# Altium footprint library SparkFun-Connectors.PCBLIB: 409 footprints (part 17 of 26)
Each footprint in its own frame and in the unit in brackets; x right, y up, seen from the top. Pads: shape width x height; smd on the part's side, far side on the other; paste and mask are expansions set on the pad; w line width, h text height; cw(c..) or ccw(c..) is an arc to the next point about the centre after c.
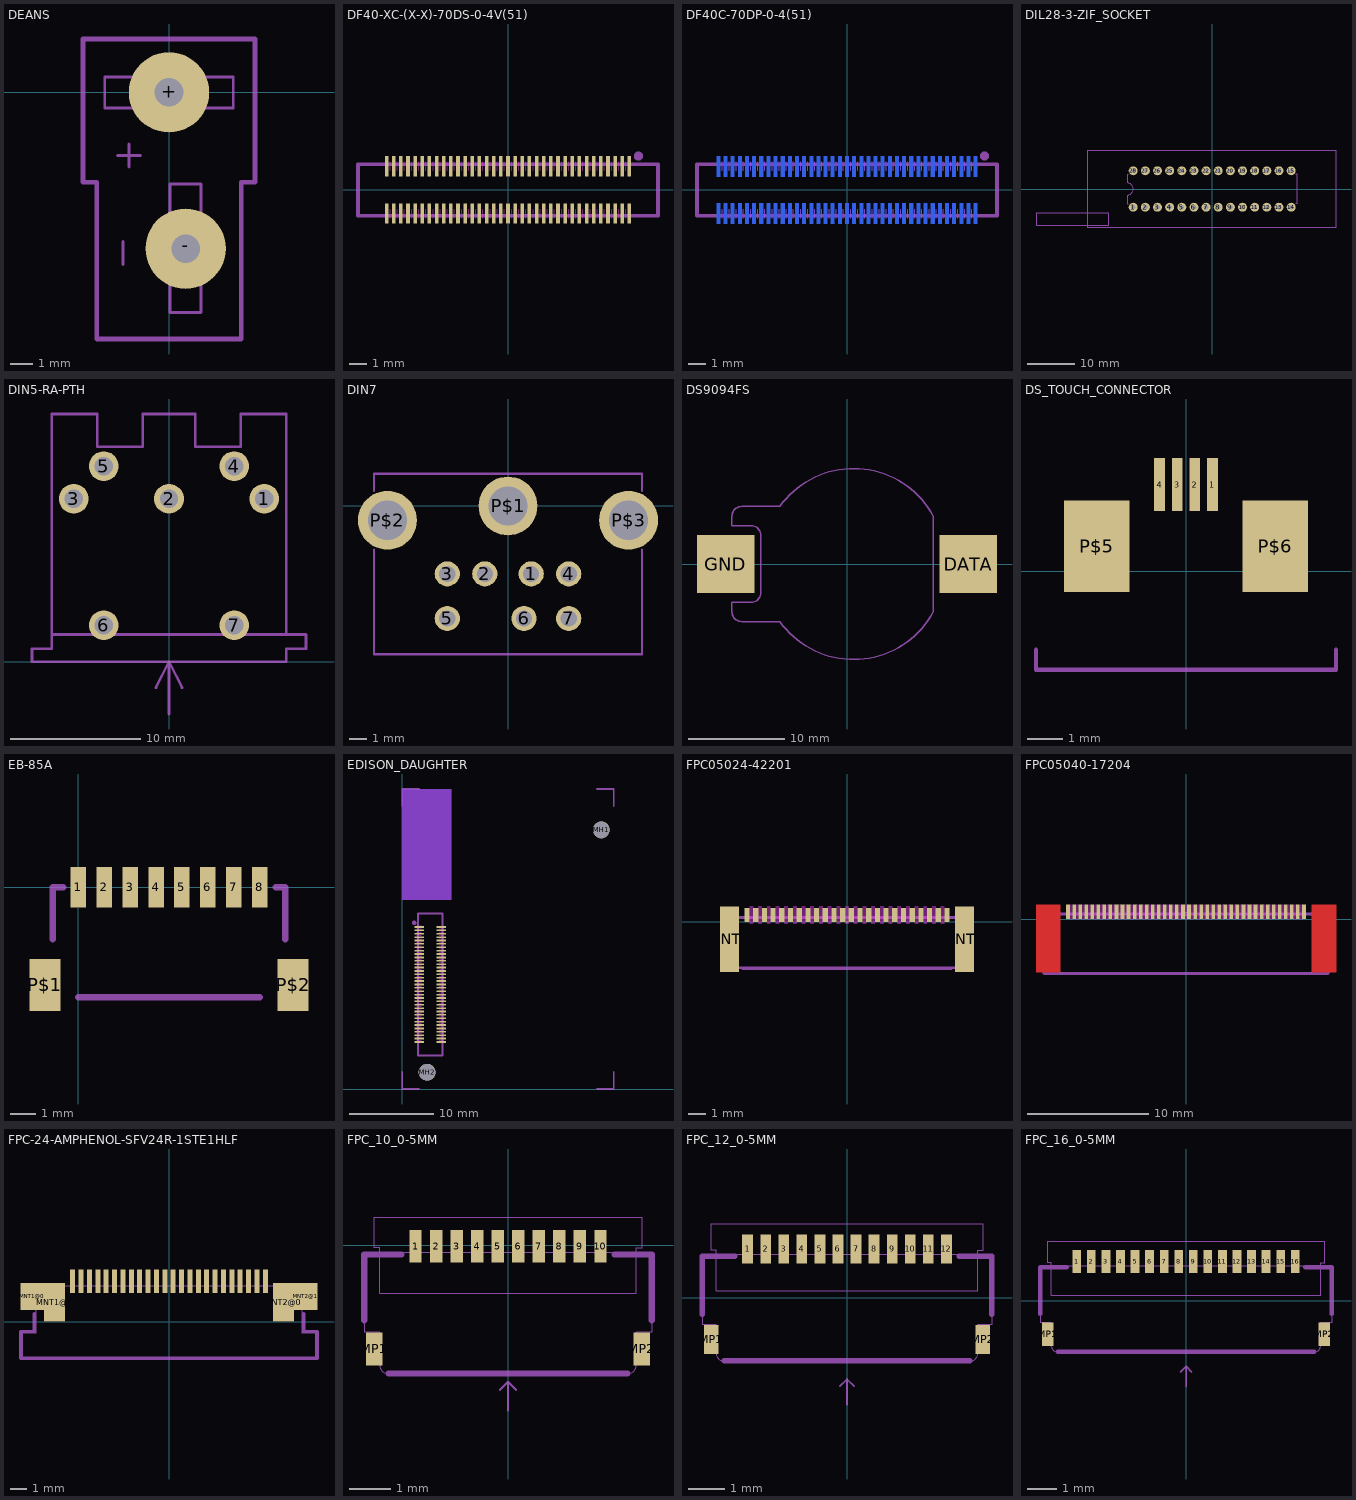
[diagram p16: the footprints below, top view; thin cyan lines are the x and y axes]

## DEANS [mil]
pads (2):
  round 140 hole 50: +(0,0) -(29,-272.5)
Dimension:
  lines w5: -112,-27 112,-27 112,27 -112,27 -112,-27 ; 2,-384 2,-160 56,-160 56,-384 2,-384
tPlace:
  lines w5: -90,-110 -50,-110 ; -80,-300 -80,-260 ; -70,-130 -70,-90
  lines w8: -150,-157 -150,93 150,93 150,-157 126,-157 126,-430 -126,-430 -126,-157 -150,-157

## DF40-XC-(X-X)-70DS-0-4V(51) [mm]
pads (70):
  rect 0.2x1.14 smd: 1(6.8,1.32) 2(6.8,-1.32) 3(6.4,1.32) 4(6.4,-1.32) 5(6,1.32) 6(6,-1.32) 7(5.6,1.32) 8(5.6,-1.32) 9(5.2,1.32) 10(5.2,-1.32) 11(4.8,1.32) 12(4.8,-1.32) 13(4.4,1.32) 14(4.4,-1.32) 15(4,1.32) 16(4,-1.32) 17(3.6,1.32) 18(3.6,-1.32) 19(3.2,1.32) 20(3.2,-1.32) 21(2.8,1.32) 22(2.8,-1.32) 23(2.4,1.32) 24(2.4,-1.32) 25(2,1.32) 26(2,-1.32) 27(1.6,1.32) 28(1.6,-1.32) 29(1.2,1.32) 30(1.2,-1.32) 31(0.8,1.32) 32(0.8,-1.32) 33(0.4,1.32) 34(0.4,-1.32) 35(0,1.32) 36(0,-1.32) 37(-0.4,1.32) 38(-0.4,-1.32) 39(-0.8,1.32) 40(-0.8,-1.32) 41(-1.2,1.32) 42(-1.2,-1.32) 43(-1.6,1.32) 44(-1.6,-1.32) 45(-2,1.32) 46(-2,-1.32) 47(-2.4,1.32) 48(-2.4,-1.32) 49(-2.8,1.32) 50(-2.8,-1.32) 51(-3.2,1.32) 52(-3.2,-1.32) 53(-3.6,1.32) 54(-3.6,-1.32) 55(-4,1.32) 56(-4,-1.32) 57(-4.4,1.32) 58(-4.4,-1.32) 59(-4.8,1.32) 60(-4.8,-1.32) 61(-5.2,1.32) 62(-5.2,-1.32) 63(-5.6,1.32) 64(-5.6,-1.32) 65(-6,1.32) 66(-6,-1.32) 67(-6.4,1.32) 68(-6.4,-1.32) 69(-6.8,1.32) 70(-6.8,-1.32)
Top keep-out:
  lines w0.051: -6.6,-1.581 -6.6,-1.069 ; -6.6,1.064 -6.6,1.576 ; -6.2,-1.581 -6.2,-1.069 ; -6.2,1.064 -6.2,1.576 ; -5.8,-1.581 -5.8,-1.069 ; -5.8,1.064 -5.8,1.576 ; -5.4,-1.581 -5.4,-1.069 ; -5.4,1.064 -5.4,1.576 ; -5,-1.581 -5,-1.069 ; -5,1.064 -5,1.576 ; -4.6,-1.581 -4.6,-1.069 ; -4.6,1.064 -4.6,1.576 ; -4.2,-1.581 -4.2,-1.069 ; -4.2,1.064 -4.2,1.576 ; -3.8,-1.581 -3.8,-1.069 ; -3.8,1.064 -3.8,1.576 ; -3.4,-1.581 -3.4,-1.069 ; -3.4,1.064 -3.4,1.576 ; -3,-1.581 -3,-1.069 ; -3,1.064 -3,1.576 ; -2.6,-1.581 -2.6,-1.069 ; -2.6,1.064 -2.6,1.576 ; -2.2,-1.581 -2.2,-1.069 ; -2.2,1.064 -2.2,1.576 ; -1.8,-1.581 -1.8,-1.069 ; -1.8,1.064 -1.8,1.576 ; -1.4,-1.581 -1.4,-1.069 ; -1.4,1.064 -1.4,1.576 ; -1,-1.581 -1,-1.069 ; -1,1.064 -1,1.576 ; -0.6,-1.581 -0.6,-1.069 ; -0.6,1.064 -0.6,1.576 ; -0.2,-1.581 -0.2,-1.069 ; -0.2,1.064 -0.2,1.576 ; 0.2,-1.581 0.2,-1.069 ; 0.2,1.064 0.2,1.576 ; 0.6,-1.581 0.6,-1.069 ; 0.6,1.064 0.6,1.576 ; 1,-1.581 1,-1.069 ; 1,1.064 1,1.576 ; 1.4,-1.581 1.4,-1.069 ; 1.4,1.064 1.4,1.576 ; 1.8,-1.581 1.8,-1.069 ; 1.8,1.064 1.8,1.576 ; 2.2,-1.581 2.2,-1.069 ; 2.2,1.064 2.2,1.576 ; 2.6,-1.581 2.6,-1.069 ; 2.6,1.064 2.6,1.576 ; 3,-1.581 3,-1.069 ; 3,1.064 3,1.576 ; 3.4,-1.581 3.4,-1.069 ; 3.4,1.064 3.4,1.576 ; 3.8,-1.581 3.8,-1.069 ; 3.8,1.064 3.8,1.576 ; 4.2,-1.581 4.2,-1.069 ; 4.2,1.064 4.2,1.576 ; 4.6,-1.581 4.6,-1.069 ; 4.6,1.064 4.6,1.576 ; 5,-1.581 5,-1.069 ; 5,1.064 5,1.576 ; 5.4,-1.581 5.4,-1.069 ; 5.4,1.064 5.4,1.576 ; 5.8,-1.581 5.8,-1.069 ; 5.8,1.064 5.8,1.576 ; 6.2,-1.581 6.2,-1.069 ; 6.2,1.064 6.2,1.576 ; 6.6,-1.581 6.6,-1.069 ; 6.6,1.064 6.6,1.576
tPlace:
  circle w0.305: c7.3,1.9 r0.1
  lines w0.203: -8.4,-1.44 8.4,-1.44 8.4,1.44 -8.4,1.44 -8.4,-1.44

## DF40C-70DP-0-4(51) [mm]
pads (74):
  rect 0.2x1.14 smd far side: 1(6.8,1.32) 2(6.8,-1.32) 3(6.4,1.32) 4(6.4,-1.32) 5(6,1.32) 6(6,-1.32) 7(5.6,1.32) 8(5.6,-1.32) 9(5.2,1.32) 10(5.2,-1.32) 11(4.8,1.32) 12(4.8,-1.32) 13(4.4,1.32) 14(4.4,-1.32) 15(4,1.32) 16(4,-1.32) 17(3.6,1.32) 18(3.6,-1.32) 19(3.2,1.32) 20(3.2,-1.32) 21(2.8,1.32) 22(2.8,-1.32) 23(2.4,1.32) 24(2.4,-1.32) 25(2,1.32) 26(2,-1.32) 27(1.6,1.32) 28(1.6,-1.32) 29(1.2,1.32) 30(1.2,-1.32) 31(0.8,1.32) 32(0.8,-1.32) 33(0.4,1.32) 34(0.4,-1.32) 35(0,1.32) 36(0,-1.32) 37(-0.4,1.32) 38(-0.4,-1.32) 39(-0.8,1.32) 40(-0.8,-1.32) 41(-1.2,1.32) 42(-1.2,-1.32) 43(-1.6,1.32) 44(-1.6,-1.32) 45(-2,1.32) 46(-2,-1.32) 47(-2.4,1.32) 48(-2.4,-1.32) 49(-2.8,1.32) 50(-2.8,-1.32) 51(-3.2,1.32) 52(-3.2,-1.32) 53(-3.6,1.32) 54(-3.6,-1.32) 55(-4,1.32) 56(-4,-1.32) 57(-4.4,1.32) 58(-4.4,-1.32) 59(-4.8,1.32) 60(-4.8,-1.32) 61(-5.2,1.32) 62(-5.2,-1.32) 63(-5.6,1.32) 64(-5.6,-1.32) 65(-6,1.32) 66(-6,-1.32) 67(-6.4,1.32) 68(-6.4,-1.32) 69(-6.8,1.32) 70(-6.8,-1.32) NC1(7.2,1.32) NC2(7.2,-1.32) NC3(-7.2,-1.32) NC4(-7.2,1.32)
Bottom keep-out:
  lines w0.051: -7,-1.581 -7,-1.069 ; -7,1.064 -7,1.576 ; -6.6,-1.581 -6.6,-1.069 ; -6.6,1.064 -6.6,1.576 ; -6.2,-1.581 -6.2,-1.069 ; -6.2,1.064 -6.2,1.576 ; -5.8,-1.581 -5.8,-1.069 ; -5.8,1.064 -5.8,1.576 ; -5.4,-1.581 -5.4,-1.069 ; -5.4,1.064 -5.4,1.576 ; -5,-1.581 -5,-1.069 ; -5,1.064 -5,1.576 ; -4.6,-1.581 -4.6,-1.069 ; -4.6,1.064 -4.6,1.576 ; -4.2,-1.581 -4.2,-1.069 ; -4.2,1.064 -4.2,1.576 ; -3.8,-1.581 -3.8,-1.069 ; -3.8,1.064 -3.8,1.576 ; -3.4,-1.581 -3.4,-1.069 ; -3.4,1.064 -3.4,1.576 ; -3,-1.581 -3,-1.069 ; -3,1.064 -3,1.576 ; -2.6,-1.581 -2.6,-1.069 ; -2.6,1.064 -2.6,1.576 ; -2.2,-1.581 -2.2,-1.069 ; -2.2,1.064 -2.2,1.576 ; -1.8,-1.581 -1.8,-1.069 ; -1.8,1.064 -1.8,1.576 ; -1.4,-1.581 -1.4,-1.069 ; -1.4,1.064 -1.4,1.576 ; -1,-1.581 -1,-1.069 ; -1,1.064 -1,1.576 ; -0.6,-1.581 -0.6,-1.069 ; -0.6,1.064 -0.6,1.576 ; -0.2,-1.581 -0.2,-1.069 ; -0.2,1.064 -0.2,1.576 ; 0.2,-1.581 0.2,-1.069 ; 0.2,1.064 0.2,1.576 ; 0.6,-1.581 0.6,-1.069 ; 0.6,1.064 0.6,1.576 ; 1,-1.581 1,-1.069 ; 1,1.064 1,1.576 ; 1.4,-1.581 1.4,-1.069 ; 1.4,1.064 1.4,1.576 ; 1.8,-1.581 1.8,-1.069 ; 1.8,1.064 1.8,1.576 ; 2.2,-1.581 2.2,-1.069 ; 2.2,1.064 2.2,1.576 ; 2.6,-1.581 2.6,-1.069 ; 2.6,1.064 2.6,1.576 ; 3,-1.581 3,-1.069 ; 3,1.064 3,1.576 ; 3.4,-1.581 3.4,-1.069 ; 3.4,1.064 3.4,1.576 ; 3.8,-1.581 3.8,-1.069 ; 3.8,1.064 3.8,1.576 ; 4.2,-1.581 4.2,-1.069 ; 4.2,1.064 4.2,1.576 ; 4.6,-1.581 4.6,-1.069 ; 4.6,1.064 4.6,1.576 ; 5,-1.581 5,-1.069 ; 5,1.064 5,1.576 ; 5.4,-1.581 5.4,-1.069 ; 5.4,1.064 5.4,1.576 ; 5.8,-1.581 5.8,-1.069 ; 5.8,1.064 5.8,1.576 ; 6.2,-1.581 6.2,-1.069 ; 6.2,1.064 6.2,1.576 ; 6.6,-1.581 6.6,-1.069 ; 6.6,1.064 6.6,1.576 ; 7,-1.581 7,-1.069 ; 7,1.064 7,1.576
bPlace:
  circle w0.305: c7.7,1.9 r0.1
  lines w0.203: -8.4,-1.44 8.4,-1.44 8.4,1.44 -8.4,1.44 -8.4,-1.44

## DIL28-3-ZIF_SOCKET [mil]
pads (28):
  round 74 hole 40: 1(-650,-150) 2(-550,-150) 3(-450,-150) 4(-350,-150) 5(-250,-150) 6(-150,-150) 7(-50,-150) 8(50,-150) 9(150,-150) 10(250,-150) 11(350,-150) 12(450,-150) 13(550,-150) 14(650,-150) 15(650,150) 16(550,150) 17(450,150) 18(350,150) 19(250,150) 20(150,150) 21(50,150) 22(-50,150) 23(-150,150) 24(-250,150) 25(-350,150) 26(-450,150) 27(-550,150) 28(-650,150)
tDocu:
  lines w5: -1027.99,-314.96 1019.25,-314.96 1019.25,314.96 -1027.99,314.96 -1027.99,-314.96
  lines w10: -1450,-300 -1450,-200 -850,-200 -850,-300 -1450,-300
tPlace:
  lines w8: -690,-120 -700,-120 -700,-50 ccw(c-700,0) -700,50 -700,120 -690,120 ; 690,-120 700,-120 700,120 690,120

## DIN5-RA-PTH [mil]
pads (7):
  round 90 hole 55.12: 1(287.4,492.13) 2(0,492.13) 3(-287.4,492.13) 4(196.85,590.55) 5(-196.85,590.55) 6(-196.85,110.24) 7(196.85,110.24)
tDocu:
  lines w8: -157.48,0 0,0 ; -39.37,-78.74 0,0 ; 0,-157.48 0,0 ; 39.37,-78.74 0,0 ; 157.48,0 0,0
  text "BOARD EDGE" at 0,-170 h27.2
tPlace:
  lines w8: -354.33,78.74 -354.33,39.37 -413.39,39.37 -413.39,0 354.33,0 354.33,39.37 413.39,39.37 413.39,82.68 354.33,82.68 ; 354.33,82.68 354.33,748.03 216.54,748.03 216.54,649.61 78.74,649.61 78.74,748.03 -78.74,748.03 -78.74,649.61 -216.54,649.61 -216.54,748.03 -354.33,748.03 -354.33,82.68 354.33,82.68
  text "DIN-5" at -105.12,253.54 h56.1

## DIN7 [mil]
pads (10):
  round 55.43 hole 35.43: 1(51.18,-149.61) 2(-51.18,-149.61) 3(-133.86,-149.61) 4(133.86,-149.61) 5(-133.86,-248.03) 6(35.43,-248.03) 7(133.86,-248.03)
  round 129.91 hole 86.61: P$1(0,0) P$2(-265.75,-31.5) P$3(265.75,-31.5)
tPlace:
  lines w5: -295.28,-96.46 -295.28,-326.77 295.28,-326.77 295.28,-96.46 ; -295.28,33.46 -295.28,70.87 295.28,70.87 295.28,33.46

## DS9094FS [mm]
pads (2):
  rect 6x6 smd: DATA(12.65,0) GND(-12.65,0)
tPlace:
  lines w0.152: -12,-5 -12,-4 -10,-4 ccw(c-10,-3) -9,-3 -9,3 ccw(c-10,3) -10,4 -12,4 -12,5 cw(c-11,5) -11,6 -7,6 cw(c0.688,0.514) 9,5 9,-5 cw(c0.688,-0.514) -7,-6 -11,-6 cw(c-11,-5) -12,-5

## DS_TOUCH_CONNECTOR [mm]
pads (6):
  rect 0.3x1.5 smd: 1(0.75,2.45) 2(0.25,2.45) 3(-0.25,2.45) 4(-0.75,2.45)
  rect 1.85x2.6 smd: P$5(-2.525,0.7) P$6(2.525,0.7)
tPlace:
  lines w0.127: -4.25,-2.23 -4.25,-2.8 4.25,-2.8 4.25,-2.23

## EB-85A [mm]
pads (10):
  rect 0.6x1.55 smd: 1(0,0) 2(1,0) 3(2,0) 4(3,0) 5(4,0) 6(5,0) 7(6,0) 8(7,0)
  rect 1.2x2 smd: P$1(-1.3,-3.775) P$2(8.3,-3.775)
tPlace:
  lines w0.254: -1,-2 -1,0 -0.6,0 ; 0,-4.25 7,-4.25 ; 7.625,0 8,0 8,-2

## EDISON_DAUGHTER [mm]
pads (72):
  rect 1.14x0.2 smd: 1(1.98,19.17) 2(4.62,19.17) 3(1.98,18.77) 4(4.62,18.77) 5(1.98,18.37) 6(4.62,18.37) 7(1.98,17.97) 8(4.62,17.97) 9(1.98,17.57) 10(4.62,17.57) 11(1.98,17.17) 12(4.62,17.17) 13(1.98,16.77) 14(4.62,16.77) 15(1.98,16.37) 16(4.62,16.37) 17(1.98,15.97) 18(4.62,15.97) 19(1.98,15.57) 20(4.62,15.57) 21(1.98,15.17) 22(4.62,15.17) 23(1.98,14.77) 24(4.62,14.77) 25(1.98,14.37) 26(4.62,14.37) 27(1.98,13.97) 28(4.62,13.97) 29(1.98,13.57) 30(4.62,13.57) 31(1.98,13.17) 32(4.62,13.17) 33(1.98,12.77) 34(4.62,12.77) 35(1.98,12.37) 36(4.62,12.37) 37(1.98,11.97) 38(4.62,11.97) 39(1.98,11.57) 40(4.62,11.57) 41(1.98,11.17) 42(4.62,11.17) 43(1.98,10.77) 44(4.62,10.77) 45(1.98,10.37) 46(4.62,10.37) 47(1.98,9.97) 48(4.62,9.97) 49(1.98,9.57) 50(4.62,9.57) 51(1.98,9.17) 52(4.62,9.17) 53(1.98,8.77) 54(4.62,8.77) 55(1.98,8.37) 56(4.62,8.37) 57(1.98,7.97) 58(4.62,7.97) 59(1.98,7.57) 60(4.62,7.57) 61(1.98,7.17) 62(4.62,7.17) 63(1.98,6.77) 64(4.62,6.77) 65(1.98,6.37) 66(4.62,6.37) 67(1.98,5.97) 68(4.62,5.97) 69(1.98,5.57) 70(4.62,5.57)
  round 2 hole 2 unplated: MH1(23.53,30.67) MH2(2.93,1.98)
Top keep-out:
  region: 5.78,35.5 5.78,22.39 0,22.39 0,35.5
  lines w0.025: 1.663,19.319 2.297,19.319
  lines w0.051: 1.724,5.77 2.236,5.77 ; 1.724,6.17 2.236,6.17 ; 1.724,6.57 2.236,6.57 ; 1.724,6.97 2.236,6.97 ; 1.724,7.37 2.236,7.37 ; 1.724,7.77 2.236,7.77 ; 1.724,8.17 2.236,8.17 ; 1.724,8.57 2.236,8.57 ; 1.724,8.97 2.236,8.97 ; 1.724,9.37 2.236,9.37 ; 1.724,9.77 2.236,9.77 ; 1.724,10.17 2.236,10.17 ; 1.724,10.57 2.236,10.57 ; 1.724,10.97 2.236,10.97 ; 1.724,11.37 2.236,11.37 ; 1.724,11.77 2.236,11.77 ; 1.724,12.17 2.236,12.17 ; 1.724,12.57 2.236,12.57 ; 1.724,12.97 2.236,12.97 ; 1.724,13.37 2.236,13.37 ; 1.724,13.77 2.236,13.77 ; 1.724,14.17 2.236,14.17 ; 1.724,14.57 2.236,14.57 ; 1.724,14.97 2.236,14.97 ; 1.724,15.37 2.236,15.37 ; 1.724,15.77 2.236,15.77 ; 1.724,16.17 2.236,16.17 ; 1.724,16.57 2.236,16.57 ; 1.724,16.97 2.236,16.97 ; 1.724,17.37 2.236,17.37 ; 1.724,17.77 2.236,17.77 ; 1.724,18.17 2.236,18.17 ; 1.724,18.57 2.236,18.57 ; 1.724,18.97 2.236,18.97 ; 4.369,5.77 4.881,5.77 ; 4.369,6.17 4.881,6.17 ; 4.369,6.57 4.881,6.57 ; 4.369,6.97 4.881,6.97 ; 4.369,7.37 4.881,7.37 ; 4.369,7.77 4.881,7.77 ; 4.369,8.17 4.881,8.17 ; 4.369,8.57 4.881,8.57 ; 4.369,8.97 4.881,8.97 ; 4.369,9.37 4.881,9.37 ; 4.369,9.77 4.881,9.77 ; 4.369,10.17 4.881,10.17 ; 4.369,10.57 4.881,10.57 ; 4.369,10.97 4.881,10.97 ; 4.369,11.37 4.881,11.37 ; 4.369,11.77 4.881,11.77 ; 4.369,12.17 4.881,12.17 ; 4.369,12.57 4.881,12.57 ; 4.369,12.97 4.881,12.97 ; 4.369,13.37 4.881,13.37 ; 4.369,13.77 4.881,13.77 ; 4.369,14.17 4.881,14.17 ; 4.369,14.57 4.881,14.57 ; 4.369,14.97 4.881,14.97 ; 4.369,15.37 4.881,15.37 ; 4.369,15.77 4.881,15.77 ; 4.369,16.17 4.881,16.17 ; 4.369,16.57 4.881,16.57 ; 4.369,16.97 4.881,16.97 ; 4.369,17.37 4.881,17.37 ; 4.369,17.77 4.881,17.77 ; 4.369,18.17 4.881,18.17 ; 4.369,18.57 4.881,18.57 ; 4.369,18.97 4.881,18.97
Bottom keep-out:
  region: 5.78,35.5 5.78,22.39 0,22.39 0,35.5
tPlace:
  circle w0.305: c1.4,19.67 r0.1
  lines w0.203: 0,2 0,0 2,0 ; 0,33.5 0,35.5 2,35.5 ; 23,0 25,0 25,2 ; 23,35.5 25,35.5 25,33.5 ; 1.86,3.97 1.86,20.77 4.74,20.77 4.74,3.97 1.86,3.97

## FPC05024-42201 [mil]
pads (26):
  rect 11.81x31.5 smd: 1(226.38,15.75) 2(206.69,15.75) 3(187.01,15.75) 4(167.32,15.75) 5(147.64,15.75) 6(127.95,15.75) 7(108.27,15.75) 8(88.58,15.75) 9(68.9,15.75) 10(49.21,15.75) 11(29.53,15.75) 12(9.84,15.75) 13(-9.84,15.75) 14(-29.53,15.75) 15(-49.21,15.75) 16(-68.9,15.75) 17(-88.58,15.75) 18(-108.27,15.75) 19(-127.95,15.75) 20(-147.64,15.75) 21(-167.32,15.75) 22(-187.01,15.75) 23(-206.69,15.75) 24(-226.38,15.75)
  rect 43.31x147.64 smd: MNT1(-265.75,-39.37) MNT2(265.75,-39.37)
Top keep-out:
  region: -220.47,-3.94 -220.47,35.43 -212.6,35.43 -212.6,-3.94
  region: -200.79,-3.94 -200.79,35.43 -192.91,35.43 -192.91,-3.94
  region: -181.1,-3.94 -181.1,35.43 -173.23,35.43 -173.23,-3.94
  region: -161.42,-3.94 -161.42,35.43 -153.54,35.43 -153.54,-3.94
  region: -141.73,-3.94 -141.73,35.43 -133.86,35.43 -133.86,-3.94
  region: -122.05,-3.94 -122.05,35.43 -114.17,35.43 -114.17,-3.94
  region: -102.36,-3.94 -102.36,35.43 -94.49,35.43 -94.49,-3.94
  region: -82.68,-3.94 -82.68,35.43 -74.8,35.43 -74.8,-3.94
  region: -62.99,-3.94 -62.99,35.43 -55.12,35.43 -55.12,-3.94
  region: -43.31,-3.94 -43.31,35.43 -35.43,35.43 -35.43,-3.94
  region: -23.62,-3.94 -23.62,35.43 -15.75,35.43 -15.75,-3.94
  region: -3.94,-3.94 -3.94,35.43 3.94,35.43 3.94,-3.94
  region: 15.75,-3.94 15.75,35.43 23.62,35.43 23.62,-3.94
  region: 35.43,-3.94 35.43,35.43 43.31,35.43 43.31,-3.94
  region: 55.12,-3.94 55.12,35.43 62.99,35.43 62.99,-3.94
  region: 74.8,-3.94 74.8,35.43 82.68,35.43 82.68,-3.94
  region: 94.49,-3.94 94.49,35.43 102.36,35.43 102.36,-3.94
  region: 114.17,-3.94 114.17,35.43 122.05,35.43 122.05,-3.94
  region: 133.86,-3.94 133.86,35.43 141.73,35.43 141.73,-3.94
  region: 153.54,-3.94 153.54,35.43 161.42,35.43 161.42,-3.94
  region: 173.23,-3.94 173.23,35.43 181.1,35.43 181.1,-3.94
  region: 192.91,-3.94 192.91,35.43 200.79,35.43 200.79,-3.94
  region: 212.6,-3.94 212.6,35.43 220.47,35.43 220.47,-3.94
tDocu:
  lines w6: -275.59,-104.33 275.59,-104.33 275.59,9.84 -275.59,9.84 -275.59,-104.33
tPlace:
  lines w6: -236.22,-106.3 236.22,-106.3

## FPC05040-17204 [mil]
pads (40):
  rect 11.81x47.24 smd: P$1(-383.86,23.62) P$2(-364.17,23.62) P$3(-344.49,23.62) P$4(-324.8,23.62) P$5(-305.12,23.62) P$6(-285.43,23.62) P$7(-265.75,23.62) P$8(-246.06,23.62) P$9(-226.38,23.62) P$10(-206.69,23.62) P$11(-187.01,23.62) P$12(-167.32,23.62) P$13(-147.64,23.62) P$14(-127.95,23.62) P$15(-108.27,23.62) P$16(-88.58,23.62) P$17(-68.9,23.62) P$18(-49.21,23.62) P$19(-29.53,23.62) P$20(-9.84,23.62) P$21(9.84,23.62) P$22(29.53,23.62) P$23(49.21,23.62) P$24(68.9,23.62) P$25(88.58,23.62) P$26(108.27,23.62) P$27(127.95,23.62) P$28(147.64,23.62) P$29(167.32,23.62) P$30(187.01,23.62) P$31(206.69,23.62) P$32(226.38,23.62) P$33(246.06,23.62) P$34(265.75,23.62) P$35(285.43,23.62) P$36(305.12,23.62) P$37(324.8,23.62) P$38(344.49,23.62) P$39(364.17,23.62) P$40(383.86,23.62)
Top:
  region: -409.45,47.24 -488.19,47.24 -488.19,-173.23 -409.45,-173.23
  region: 409.45,47.24 409.45,-173.23 488.19,-173.23 488.19,47.24
Top keep-out:
  region: -377.95,0 -377.95,47.24 -370.08,47.24 -370.08,0
  region: -358.27,0 -358.27,47.24 -350.39,47.24 -350.39,0
  region: -338.58,0 -338.58,47.24 -330.71,47.24 -330.71,0
  region: -318.9,0 -318.9,47.24 -311.02,47.24 -311.02,0
  region: -299.21,0 -299.21,47.24 -291.34,47.24 -291.34,0
  region: -279.53,0 -279.53,47.24 -271.65,47.24 -271.65,0
  region: -259.84,0 -259.84,47.24 -251.97,47.24 -251.97,0
  region: -240.16,0 -240.16,47.24 -232.28,47.24 -232.28,0
  region: -220.47,0 -220.47,47.24 -212.6,47.24 -212.6,0
  region: -200.79,0 -200.79,47.24 -192.91,47.24 -192.91,0
  region: -181.1,0 -181.1,47.24 -173.23,47.24 -173.23,0
  region: -161.42,0 -161.42,47.24 -153.54,47.24 -153.54,0
  region: -141.73,0 -141.73,47.24 -133.86,47.24 -133.86,0
  region: -122.05,0 -122.05,47.24 -114.17,47.24 -114.17,0
  region: -102.36,0 -102.36,47.24 -94.49,47.24 -94.49,0
  region: -82.68,0 -82.68,47.24 -74.8,47.24 -74.8,0
  region: -62.99,0 -62.99,47.24 -55.12,47.24 -55.12,0
  region: -43.31,0 -43.31,47.24 -35.43,47.24 -35.43,0
  region: -23.62,0 -23.62,47.24 -15.75,47.24 -15.75,0
  region: -3.94,0 -3.94,47.24 3.94,47.24 3.94,0
  region: 15.75,0 15.75,47.24 23.62,47.24 23.62,0
  region: 35.43,0 35.43,47.24 43.31,47.24 43.31,0
  region: 55.12,0 55.12,47.24 62.99,47.24 62.99,0
  region: 74.8,0 74.8,47.24 82.68,47.24 82.68,0
  region: 94.49,0 94.49,47.24 102.36,47.24 102.36,0
  region: 114.17,0 114.17,47.24 122.05,47.24 122.05,0
  region: 133.86,0 133.86,47.24 141.73,47.24 141.73,0
  region: 153.54,0 153.54,47.24 161.42,47.24 161.42,0
  region: 173.23,0 173.23,47.24 181.1,47.24 181.1,0
  region: 192.91,0 192.91,47.24 200.79,47.24 200.79,0
  region: 212.6,0 212.6,47.24 220.47,47.24 220.47,0
  region: 232.28,0 232.28,47.24 240.16,47.24 240.16,0
  region: 251.97,0 251.97,47.24 259.84,47.24 259.84,0
  region: 271.65,0 271.65,47.24 279.53,47.24 279.53,0
  region: 291.34,0 291.34,47.24 299.21,47.24 299.21,0
  region: 311.02,0 311.02,47.24 318.9,47.24 318.9,0
  region: 330.71,0 330.71,47.24 338.58,47.24 338.58,0
  region: 350.39,0 350.39,47.24 358.27,47.24 358.27,0
  region: 370.08,0 370.08,47.24 377.95,47.24 377.95,0
Top Paste:
  region: 413,-140 413,-61 484,-61 484,-140
  region: -484,-140 -484,-61 -413,-61 -413,-140
Top Solder:
  region: -488,-144 -488,-57 -409,-57 -409,-144
  region: 409,-144 409,-57 488,-57 488,-144
tDocu:
  lines w10: -462.6,-177.17 462.6,-177.17 462.6,15.75 -462.6,15.75 -462.6,-177.17
  text "Insert This Side" at -133.86,-165.35 h42.72

## FPC-24-AMPHENOL-SFV24R-1STE1HLF [mil]
pads (28):
  rect 11.81x55.12 smd: 1(226.38,94.49) 2(206.69,94.49) 3(187.01,94.49) 4(167.32,94.49) 5(147.64,94.49) 6(127.95,94.49) 7(108.27,94.49) 8(88.58,94.49) 9(68.9,94.49) 10(49.21,94.49) 11(29.53,94.49) 12(9.84,94.49) 13(-9.84,94.49) 14(-29.53,94.49) 15(-49.21,94.49) 16(-68.9,94.49) 17(-88.58,94.49) 18(-108.27,94.49) 19(-127.95,94.49) 20(-147.64,94.49) 21(-167.32,94.49) 22(-187.01,94.49) 23(-206.69,94.49) 24(-226.38,94.49)
  rect 55.12x62.99 smd: MNT1@0(-320.87,59.06) MNT2@1(320.87,59.06)
  rect 49.21x90.55 smd: MNT1@1(-268.7,45.28) MNT2@0(268.7,45.28)
tDocu:
  region: -229.92,82.68 -229.92,110.24 -222.83,110.24 -222.83,82.68
  region: -210.24,82.68 -210.24,110.24 -203.15,110.24 -203.15,82.68
  region: -190.55,82.68 -190.55,110.24 -183.46,110.24 -183.46,82.68
  region: -170.87,82.68 -170.87,110.24 -163.78,110.24 -163.78,82.68
  region: -151.18,82.68 -151.18,110.24 -144.09,110.24 -144.09,82.68
  region: -131.5,82.68 -131.5,110.24 -124.41,110.24 -124.41,82.68
  region: -111.81,82.68 -111.81,110.24 -104.72,110.24 -104.72,82.68
  region: -92.13,82.68 -92.13,110.24 -85.04,110.24 -85.04,82.68
  region: -72.44,82.68 -72.44,110.24 -65.35,110.24 -65.35,82.68
  region: -52.76,82.68 -52.76,110.24 -45.67,110.24 -45.67,82.68
  region: -33.07,82.68 -33.07,110.24 -25.98,110.24 -25.98,82.68
  region: -13.39,82.68 -13.39,110.24 -6.3,110.24 -6.3,82.68
  region: 6.3,82.68 6.3,110.24 13.39,110.24 13.39,82.68
  region: 25.98,82.68 25.98,110.24 33.07,110.24 33.07,82.68
  region: 45.67,82.68 45.67,110.24 52.76,110.24 52.76,82.68
  region: 65.35,82.68 65.35,110.24 72.44,110.24 72.44,82.68
  region: 85.04,82.68 85.04,110.24 92.13,110.24 92.13,82.68
  region: 104.72,82.68 104.72,110.24 111.81,110.24 111.81,82.68
  region: 124.41,82.68 124.41,110.24 131.5,110.24 131.5,82.68
  region: 144.09,82.68 144.09,110.24 151.18,110.24 151.18,82.68
  region: 163.78,82.68 163.78,110.24 170.87,110.24 170.87,82.68
  region: 183.46,82.68 183.46,110.24 190.55,110.24 190.55,82.68
  region: 203.15,82.68 203.15,110.24 210.24,110.24 210.24,82.68
  region: 222.83,82.68 222.83,110.24 229.92,110.24 229.92,82.68
  region: -340.55,35.83 -340.55,62.6 -312.99,62.6 -312.99,35.83
  region: 312.99,35.83 312.99,62.6 340.55,62.6 340.55,35.83
  lines w0.1: -344.49,-82.68 344.49,-82.68 344.49,-27.56 312.99,-27.56 312.99,82.68 -312.99,82.68 -312.99,-27.56 -344.49,-27.56 -344.49,-82.68
tPlace:
  lines w8: -316.99,18.68 -316.99,-23.56 -348.49,-23.56 -348.49,-86.68 348.49,-86.68 348.49,-23.56 316.99,-23.56 316.99,18.68

## FPC_10_0-5MM [mil]
pads (12):
  rect 11.81x31.5 smd paste+0: 1(-88.98,-0.79) 2(-69.29,-0.79) 3(-49.61,-0.79) 4(-29.92,-0.79) 5(-10.24,-0.79) 6(9.45,-0.79) 7(29.13,-0.79) 8(48.82,-0.79) 9(68.5,-0.79) 10(88.19,-0.79)
  rect 15.75x31.5 smd: MP1(-128.35,-99.21) MP2(127.56,-99.21)
tDocu:
  region: -91.93,-10.63 -91.93,5.12 -86.02,5.12 -86.02,-10.63
  region: -72.24,-10.63 -72.24,5.12 -66.34,5.12 -66.34,-10.63
  region: -129.33,-108.86 -129.33,-89.57 -123.43,-89.57 -123.43,-108.86
  region: 122.64,-108.86 122.64,-89.57 128.54,-89.57 128.54,-108.86
  region: -52.56,-10.63 -52.56,5.12 -46.65,5.12 -46.65,-10.63
  region: -32.87,-10.63 -32.87,5.12 -26.97,5.12 -26.97,-10.63
  region: -13.19,-10.63 -13.19,5.12 -7.28,5.12 -7.28,-10.63
  region: 6.5,-10.63 6.5,5.12 12.4,5.12 12.4,-10.63
  region: 26.18,-10.63 26.18,5.12 32.09,5.12 32.09,-10.63
  region: 45.87,-10.63 45.87,5.12 51.77,5.12 51.77,-10.63
  region: 65.55,-10.63 65.55,5.12 71.46,5.12 71.46,-10.63
  region: 85.24,-10.63 85.24,5.12 91.14,5.12 91.14,-10.63
  lines w0.39: -123.23,-6.69 -138.19,-6.69 -138.19,-83.46 -123.23,-83.46 -123.23,-114.96 ccw(c-115.02,-114.62) -114.96,-122.83 114.17,-122.83 ccw(c114.23,-114.62) 122.44,-114.96 122.44,-83.46 137.4,-83.46 137.4,-6.69 122.44,-6.69 ; -123.23,-6.69 122.44,-6.69 ; -123.23,-6.69 -123.23,-46.06 122.44,-46.06 122.44,-6.69 ; -123.23,-6.69 -123.23,-2.36 -129.13,-2.36 -129.13,26.77 128.35,26.77 128.35,-2.36 122.44,-2.36 122.44,-6.69
  lines w1.97: -8.27,-138.58 -0.39,-130.71 ; -0.39,-158.27 -0.39,-130.71 ; 7.48,-138.58 -0.39,-130.71
  text "Ribbon Insert" at -0.39,-170.08 h12.2
tPlace:
  lines w6: -138.19,-71.65 -138.19,-8.66 -102.76,-8.66 ; -114.57,-122.83 113.78,-122.83 ; 101.97,-8.66 137.4,-8.66 137.4,-71.65

## FPC_12_0-5MM [mil]
pads (14):
  rect 11.81x31.5 smd paste+0: 1(-108.27,53.15) 2(-88.58,53.15) 3(-68.9,53.15) 4(-49.21,53.15) 5(-29.53,53.15) 6(-9.84,53.15) 7(9.84,53.15) 8(29.53,53.15) 9(49.21,53.15) 10(68.9,53.15) 11(88.58,53.15) 12(108.27,53.15)
  rect 15.75x31.5 smd: MP1(-147.64,-45.28) MP2(147.64,-45.28)
tDocu:
  region: -111.22,43.31 -111.22,59.06 -105.32,59.06 -105.32,43.31
  region: -91.54,43.31 -91.54,59.06 -85.63,59.06 -85.63,43.31
  region: -148.62,-54.92 -148.62,-35.63 -142.72,-35.63 -142.72,-54.92
  region: 142.72,-54.92 142.72,-35.63 148.62,-35.63 148.62,-54.92
  region: -71.85,43.31 -71.85,59.06 -65.94,59.06 -65.94,43.31
  region: -52.17,43.31 -52.17,59.06 -46.26,59.06 -46.26,43.31
  region: -32.48,43.31 -32.48,59.06 -26.57,59.06 -26.57,43.31
  region: -12.8,43.31 -12.8,59.06 -6.89,59.06 -6.89,43.31
  region: 6.89,43.31 6.89,59.06 12.8,59.06 12.8,43.31
  region: 26.57,43.31 26.57,59.06 32.48,59.06 32.48,43.31
  region: 46.26,43.31 46.26,59.06 52.17,59.06 52.17,43.31
  region: 65.94,43.31 65.94,59.06 71.85,59.06 71.85,43.31
  region: 85.63,43.31 85.63,59.06 91.54,59.06 91.54,43.31
  region: 105.32,43.31 105.32,59.06 111.22,59.06 111.22,43.31
  lines w0.39: -142.52,47.24 -157.48,47.24 -157.48,-29.53 -142.52,-29.53 -142.52,-61.02 ccw(c-134.31,-60.68) -134.25,-68.9 134.25,-68.9 ccw(c134.31,-60.68) 142.52,-61.02 142.52,-29.53 157.48,-29.53 157.48,47.24 142.52,47.24 ; -142.52,47.24 142.52,47.24 ; -142.52,47.24 -142.52,7.87 142.52,7.87 142.52,47.24 ; -142.52,47.24 -142.52,51.57 -148.43,51.57 -148.43,80.71 148.43,80.71 148.43,51.57 142.52,51.57 142.52,47.24
  lines w1.97: -7.87,-96.46 0,-88.58 ; 0,-116.14 0,-88.58 ; 7.87,-96.46 0,-88.58
  text "Ribbon Insert" at 0,-127.95 h12.2
tPlace:
  lines w6: -157.48,-17.72 -157.48,45.28 -122.05,45.28 ; -133.86,-68.9 133.86,-68.9 ; 122.05,45.28 157.48,45.28 157.48,-17.72

## FPC_16_0-5MM [mil]
pads (18):
  rect 11.81x31.5 smd paste+0: 1(-147.64,53.15) 2(-127.95,53.15) 3(-108.27,53.15) 4(-88.58,53.15) 5(-68.9,53.15) 6(-49.21,53.15) 7(-29.53,53.15) 8(-9.84,53.15) 9(9.84,53.15) 10(29.53,53.15) 11(49.21,53.15) 12(68.9,53.15) 13(88.58,53.15) 14(108.27,53.15) 15(127.95,53.15) 16(147.64,53.15)
  rect 15.75x31.5 smd: MP1(-187.01,-45.28) MP2(187.01,-45.28)
Top Paste:
  region: -152.56,40.35 -152.56,65.94 -142.72,65.94 -142.72,40.35
  region: -132.87,40.35 -132.87,65.94 -123.03,65.94 -123.03,40.35
  region: -113.19,40.35 -113.19,65.94 -103.35,65.94 -103.35,40.35
  region: -93.5,40.35 -93.5,65.94 -83.66,65.94 -83.66,40.35
  region: -73.82,40.35 -73.82,65.94 -63.98,65.94 -63.98,40.35
  region: -54.13,40.35 -54.13,65.94 -44.29,65.94 -44.29,40.35
  region: -34.45,40.35 -34.45,65.94 -24.61,65.94 -24.61,40.35
  region: -14.76,40.35 -14.76,65.94 -4.92,65.94 -4.92,40.35
  region: 4.92,40.35 4.92,65.94 14.76,65.94 14.76,40.35
  region: 24.61,40.35 24.61,65.94 34.45,65.94 34.45,40.35
  region: 44.29,40.35 44.29,65.94 54.13,65.94 54.13,40.35
  region: 63.98,40.35 63.98,65.94 73.82,65.94 73.82,40.35
  region: 83.66,40.35 83.66,65.94 93.5,65.94 93.5,40.35
  region: 103.35,40.35 103.35,65.94 113.19,65.94 113.19,40.35
  region: 123.03,40.35 123.03,65.94 132.87,65.94 132.87,40.35
  region: 142.72,40.35 142.72,65.94 152.56,65.94 152.56,40.35
tDocu:
  region: -150.59,43.31 -150.59,59.06 -144.69,59.06 -144.69,43.31
  region: -130.91,43.31 -130.91,59.06 -125,59.06 -125,43.31
  region: -187.99,-54.92 -187.99,-35.63 -182.09,-35.63 -182.09,-54.92
  region: 182.09,-54.92 182.09,-35.63 187.99,-35.63 187.99,-54.92
  region: -111.22,43.31 -111.22,59.06 -105.32,59.06 -105.32,43.31
  region: -91.54,43.31 -91.54,59.06 -85.63,59.06 -85.63,43.31
  region: -71.85,43.31 -71.85,59.06 -65.94,59.06 -65.94,43.31
  region: -52.17,43.31 -52.17,59.06 -46.26,59.06 -46.26,43.31
  region: -32.48,43.31 -32.48,59.06 -26.57,59.06 -26.57,43.31
  region: -12.8,43.31 -12.8,59.06 -6.89,59.06 -6.89,43.31
  region: 6.89,43.31 6.89,59.06 12.8,59.06 12.8,43.31
  region: 26.57,43.31 26.57,59.06 32.48,59.06 32.48,43.31
  region: 46.26,43.31 46.26,59.06 52.17,59.06 52.17,43.31
  region: 65.94,43.31 65.94,59.06 71.85,59.06 71.85,43.31
  region: 85.63,43.31 85.63,59.06 91.54,59.06 91.54,43.31
  region: 105.32,43.31 105.32,59.06 111.22,59.06 111.22,43.31
  region: 125,43.31 125,59.06 130.91,59.06 130.91,43.31
  region: 144.69,43.31 144.69,59.06 150.59,59.06 150.59,43.31
  lines w0.39: -181.89,47.24 -196.85,47.24 -196.85,-29.53 -181.89,-29.53 -181.89,-61.02 ccw(c-173.68,-60.68) -173.62,-68.9 173.62,-68.9 ccw(c173.68,-60.68) 181.89,-61.02 181.89,-29.53 196.85,-29.53 196.85,47.24 181.89,47.24 ; -181.89,47.24 181.89,47.24 ; -181.89,47.24 -181.89,7.87 181.89,7.87 181.89,47.24 ; -181.89,47.24 -181.89,51.57 -187.8,51.57 -187.8,80.71 187.8,80.71 187.8,51.57 181.89,51.57 181.89,47.24
  lines w1.97: -7.87,-96.46 0,-88.58 ; 0,-116.14 0,-88.58 ; 7.87,-96.46 0,-88.58
  text "Ribbon Insert" at 0,-127.95 h12.2
tPlace:
  lines w6: -196.85,-17.72 -196.85,45.28 -161.42,45.28 ; -173.23,-68.9 173.23,-68.9 ; 161.42,45.28 196.85,45.28 196.85,-17.72